# Altium schematic symbol library NXP_60_26022015.SCHLIB: 1306 symbols (part 23 of 28) (continued)
## PCA24S08AD
designator U?, comment 1024 × 8-bit CMOS EEPROM with access protection The PCA24S08A provides 8192 bits of serial Electrically Erasable and Programmable Read-Only Memory (EEPROM) organized as 1024 words of 8 bits each. Data bytes are received and transmitted via the serial I2 C-bus. Access permissions limiting reads or writes are set via the I2 C-bus to isolate blocks of memory from improper access. The PCA24S08A is intended to be pin compatible with standard 24C08 serial EEPROM devices except for pins 1, 2, and 3, which are address pins in the standard part. Other exceptions to the PCA24S08A serial EEPROM data sheet are noted in Section 6.6. All bits are sent to or read from the device, most significant bit first, in a manner consistent with the 24C08 serial EEPROM. The bit fields in this document are correspondingly listed with the MSB on the left and the LSB on the right. The EEPROM memory is broken up into 8 blocks of 1 kbit (128 bytes) each. Within each block, the memory is physically organized in to 8 pages of 128 bits (16 bytes) each. In addition to these 8 kbits, there are two more 128-bit pages that are used to store the access protection and ID information. There are a total of 8448 bits of EEPROM memory available in the PCA24S08A. Access protection (both read and write) is organized on a block basis for block 1 through block 7 and on a page and a block basis for block 0. Protection information for these blocks and pages is stored in one of the additional pages of EEPROM memory that is addressed separately from the main data storage array. SeeSection 6.4 for more details. The ID value is located in the ID page of the EEPROM, the second of the additional 16 byte pages. Writes from the serial interface may include from one byte to 16 bytes at a time, depending on the protocol followed by the bus master. All page accesses must be properly aligned to the internal EEPROM page. The EEPROM memory offers an endurance of 100,000 write cycles per byte, with 10 year data retention. Writes to the EEPROM take less than 5 ms to complete. After manufacturing, all EEPROM bits will be set to a value of ‘1’.    AAL Eindhoven MK
footprint SOT96-1
pins: 3 !PR!, 4 GND (power), 5 SDA, 6 SCL, 7 WP, 8 VCC (power)

## PCA24S08ADP
designator U?, comment 1024 × 8-bit CMOS EEPROM with access protection The PCA24S08A provides 8192 bits of serial Electrically Erasable and Programmable Read-Only Memory (EEPROM) organized as 1024 words of 8 bits each. Data bytes are received and transmitted via the serial I2 C-bus. Access permissions limiting reads or writes are set via the I2 C-bus to isolate blocks of memory from improper access. The PCA24S08A is intended to be pin compatible with standard 24C08 serial EEPROM devices except for pins 1, 2, and 3, which are address pins in the standard part. Other exceptions to the PCA24S08A serial EEPROM data sheet are noted in Section 6.6. All bits are sent to or read from the device, most significant bit first, in a manner consistent with the 24C08 serial EEPROM. The bit fields in this document are correspondingly listed with the MSB on the left and the LSB on the right. The EEPROM memory is broken up into 8 blocks of 1 kbit (128 bytes) each. Within each block, the memory is physically organized in to 8 pages of 128 bits (16 bytes) each. In addition to these 8 kbits, there are two more 128-bit pages that are used to store the access protection and ID information. There are a total of 8448 bits of EEPROM memory available in the PCA24S08A. Access protection (both read and write) is organized on a block basis for block 1 through block 7 and on a page and a block basis for block 0. Protection information for these blocks and pages is stored in one of the additional pages of EEPROM memory that is addressed separately from the main data storage array. SeeSection 6.4 for more details. The ID value is located in the ID page of the EEPROM, the second of the additional 16 byte pages. Writes from the serial interface may include from one byte to 16 bytes at a time, depending on the protocol followed by the bus master. All page accesses must be properly aligned to the internal EEPROM page. The EEPROM memory offers an endurance of 100,000 write cycles per byte, with 10 year data retention. Writes to the EEPROM take less than 5 ms to complete. After manufacturing, all EEPROM bits will be set to a value of ‘1’.    AAL Eindhoven MK
footprint SOT505-1
pins: 3 !PR!, 4 GND (power), 5 SDA, 6 SCL, 7 WP, 8 VCC (power)

## PCA82C250T
designator U?, comment CAN controller interface The PCA82C250 is the interface between a CAN protocol controller and the physical bus. The device provides differential transmit capability to the bus and differential receive capability to the CAN controller.    AAL Eindhoven MK
footprint SOT96-1
pins: 1 TXD (out), 2 GND, 3 VCC, 4 RXD, 5 VREF (power), 6 CANL, 7 CANH, 8 RS

## PCA82C251T
designator U?, comment CAN transceiver for 24 V systems The PCA82C251 is the interface between a CAN protocol controller and the physical bus. The device provides differential transmit capability to the bus and differential receive capability to the CAN controller    AAL Eindhoven MK
footprint SOT96-1
pins: 1 TXD (out), 2 GND, 3 VCC, 4 RXD, 5 VREF (power), 6 CANL, 7 CANH, 8 RS

## PCA2129T
designator U?, comment Accurate RTC with integrated quartz crystal for industrial The PCF2129T is a CMOS1  Real Time Clock (RTC) and calendar with an integrated Temperature Compensated Crystal (Xtal) Oscillator (TCXO) and a 32.768 kHz quartz crystal optimized for very high accuracy and very low power consumption. The PCF2129T has a selectable I2C-bus or SPI-bus, a backup battery switch-over circuit, a programmable watchdog function, a timestamp function, and many other features.    AAL Eindhoven MK
TEMPERATURE_RANGE: -30 °C to +80 °C
footprint SOT162-1
pins: 1 SCL, 2 SDI, 3 SDO (out), 4 SDA/!CE, 5 IFS, 6 !TS!, 7 CLKOUT (out), 8 VSS (power), 13 !INT1! (out), 14 BSS (out), 15 VBAT (power), 16 VDD (power)

## PCA8565BS
designator U?, comment Real time clock/calendar The PCA8565 is a CMOS real time clock and calendar optimized for low power consumption. A programmable clock output, interrupt output and voltage-low detector are also provided. All address and data are transferred serially via a two-line bidirectional I2C-bus. Maximum bus speed is 400 kbit/s. The built-in word address register is incremented automatically after each written or read data byte. AEC-Q100 compliant (PCA8565TS) for automotive applications.    AAL Eindhoven MK
footprint SOT650
pins: 1 OSCI, 2 OSCO, 4 !INT1! (out), 5 VSS (power), 6 SDA, 7 SCL, 8 CLKOUT (power), 9 VDD (power)

## PCA8565TS
designator U?, comment Real time clock/calendar The PCA8565 is a CMOS real time clock and calendar optimized for low power consumption. A programmable clock output, interrupt output and voltage-low detector are also provided. All address and data are transferred serially via a two-line bidirectional I2C-bus. Maximum bus speed is 400 kbit/s. The built-in word address register is incremented automatically after each written or read data byte. AEC-Q100 compliant (PCA8565TS) for automotive applications.    AAL Eindhoven MK
footprint SOT505-1
pins: 1 OSCI, 2 OSCO, 3 !INT1! (out), 4 VSS (power), 5 SDA, 6 SCL, 7 CLKOUT (power), 8 VDD (power)

## PCA9509ADP
designator U?, comment The PCA9509A is a level translating I2C-bus/SMBus repeater with two voltage supplies that enables processor low voltage 2-wire serial bus to interface with standard I2C-bus or SMBus I/O.   AAL Eindhoven MK
footprint SOT505-1
pins: 1 VCC(A) (power), 2 A1, 3 A2, 4 GND (power), 5 EN, 6 B2, 7 B1, 8 VCC(B) (power)

## PCA9509AGM
designator U?, comment The PCA9509A is a level translating I2C-bus/SMBus repeater with two voltage supplies that enables processor low voltage 2-wire serial bus to interface with standard I2C-bus or SMBus I/O.   AAL Eindhoven MK
footprint SOT902-1/2/3
pins: 1 VCC(A) (power), 2 A1, 3 A2, 4 GND (power), 5 EN, 6 B2, 7 B1, 8 VCC(B) (power)

## PCA9509D
designator U?, comment The PCA9509 is a level translating I2C-bus/SMBus repeater with two voltage supplies that enables processor low voltage 2-wire serial bus to interface with standard I2C-bus or SMBus I/O.   AAL Eindhoven MK
footprint SOT96-1
pins: 1 VCC(A) (power), 2 A1, 3 A2, 4 GND (power), 5 EN, 6 B2, 7 B1, 8 VCC(B) (power)

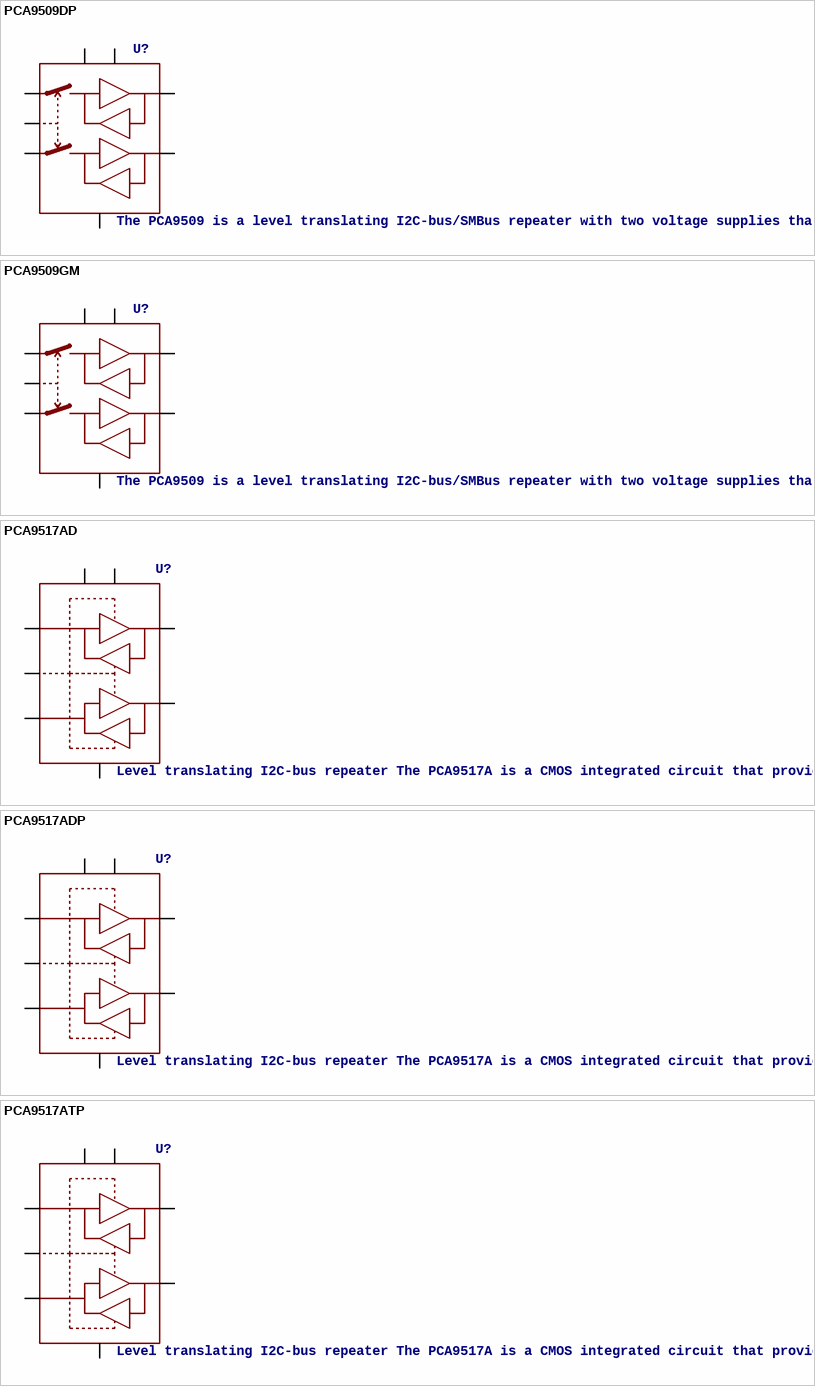
[diagram p158: symbols PCA9509DP to PCA9517ATP]

## PCA9509DP
designator U?, comment The PCA9509 is a level translating I2C-bus/SMBus repeater with two voltage supplies that enables processor low voltage 2-wire serial bus to interface with standard I2C-bus or SMBus I/O.   AAL Eindhoven MK
footprint SOT505-1
pins: 1 VCC(A) (power), 2 A1, 3 A2, 4 GND (power), 5 EN, 6 B2, 7 B1, 8 VCC(B) (power)

## PCA9509GM
designator U?, comment The PCA9509 is a level translating I2C-bus/SMBus repeater with two voltage supplies that enables processor low voltage 2-wire serial bus to interface with standard I2C-bus or SMBus I/O.   AAL Eindhoven MK
footprint SOT902-1/2/3
pins: 1 VCC(A) (power), 2 A1, 3 A2, 4 GND (power), 5 EN, 6 B2, 7 B1, 8 VCC(B) (power)

## PCA9517AD
designator U?, comment Level translating I2C-bus repeater The PCA9517A is a CMOS integrated circuit that provides level shifting between low voltage (down to 0.9 V) and higher voltage (2.7 V to 5.5 V) I2C-bus or SMBus applications. While retaining all the operating modes and features of the I2C-bus system during the level shifts, it also permits extension of the I2C-bus by providing bidirectional buffering for both the data (SDA) and the clock (SCL) lines, thus enabling two buses of 400 pF. Using the PCA9517A enables the system designer to isolate two halves of a bus for both voltage and capacitance. The SDA and SCL pins are overvoltage tolerant and are high-impedance when the PCA9517A is unpowered. The 2.7 V to 5.5 V bus port B drivers behave much like the drivers on the PCA9515A device, while the adjustable voltage bus port A drivers drive more current and eliminate the static offset voltage. This results in a LOW on the port B translating into a nearly 0 V LOW on the port A which accommodates smaller voltage swings of lower voltage logic. The static offset design of the port B PCA9517A I/O drivers prevent them from being connected to another device that has rise time accelerator including the PCA9510, PCA9511, PCA9512, PCA9513, PCA9514, PCA9515A, PCA9516A, PCA9517A (port B), or PCA9518. Port A of two or more PCA9517As can be connected together, however, to allow a star topography with port A on the common bus, and port A can be connected directly to any other buffer with static or dynamic offset voltage. Multiple PCA9517As can be connected in series, port A to port B, with no build-up in offset voltage with only time of flight delays to consider. The PCA9517A drivers are not enabled unless VCC(A) is above 0.8 V and VCC(B) is above 2.5 V. The EN pin can also be used to turn the drivers on and off under system control. Caution should be observed to only change the state of the enable pin when the bus is idle. The output pull-down on the port B internal buffer LOW is set for approximately 0.5 V, while the input threshold of the internal buffer is set about 70 mV lower (0.43 V). When the port B I/O is driven LOW internally, the LOW is not recognized as a LOW by the input. This prevents a lock-up condition from occurring. The output pull-down on port A drives a hard LOW and the input level is set at 0.3VCC(A) to accommodate the need for a lower LOW level in systems where the low voltage side supply voltage is as low as 0.9 V.    AAL Eindhoven MK
footprint SOT96-1
pins: 1 VCC(A) (power), 2 SCLA, 3 SDAA, 4 GND (power), 5 EN, 6 SDAB, 7 SCLB, 8 VCC(B) (power)

## PCA9517ADP
designator U?, comment Level translating I2C-bus repeater The PCA9517A is a CMOS integrated circuit that provides level shifting between low voltage (down to 0.9 V) and higher voltage (2.7 V to 5.5 V) I2C-bus or SMBus applications. While retaining all the operating modes and features of the I2C-bus system during the level shifts, it also permits extension of the I2C-bus by providing bidirectional buffering for both the data (SDA) and the clock (SCL) lines, thus enabling two buses of 400 pF. Using the PCA9517A enables the system designer to isolate two halves of a bus for both voltage and capacitance. The SDA and SCL pins are overvoltage tolerant and are high-impedance when the PCA9517A is unpowered. The 2.7 V to 5.5 V bus port B drivers behave much like the drivers on the PCA9515A device, while the adjustable voltage bus port A drivers drive more current and eliminate the static offset voltage. This results in a LOW on the port B translating into a nearly 0 V LOW on the port A which accommodates smaller voltage swings of lower voltage logic. The static offset design of the port B PCA9517A I/O drivers prevent them from being connected to another device that has rise time accelerator including the PCA9510, PCA9511, PCA9512, PCA9513, PCA9514, PCA9515A, PCA9516A, PCA9517A (port B), or PCA9518. Port A of two or more PCA9517As can be connected together, however, to allow a star topography with port A on the common bus, and port A can be connected directly to any other buffer with static or dynamic offset voltage. Multiple PCA9517As can be connected in series, port A to port B, with no build-up in offset voltage with only time of flight delays to consider. The PCA9517A drivers are not enabled unless VCC(A) is above 0.8 V and VCC(B) is above 2.5 V. The EN pin can also be used to turn the drivers on and off under system control. Caution should be observed to only change the state of the enable pin when the bus is idle. The output pull-down on the port B internal buffer LOW is set for approximately 0.5 V, while the input threshold of the internal buffer is set about 70 mV lower (0.43 V). When the port B I/O is driven LOW internally, the LOW is not recognized as a LOW by the input. This prevents a lock-up condition from occurring. The output pull-down on port A drives a hard LOW and the input level is set at 0.3VCC(A) to accommodate the need for a lower LOW level in systems where the low voltage side supply voltage is as low as 0.9 V.    AAL Eindhoven MK
footprint SOT505-1
pins: 1 VCC(A) (power), 2 SCLA, 3 SDAA, 4 GND (power), 5 EN, 6 SDAB, 7 SCLB, 8 VCC(B) (power)

## PCA9517ATP
designator U?, comment Level translating I2C-bus repeater The PCA9517A is a CMOS integrated circuit that provides level shifting between low voltage (down to 0.9 V) and higher voltage (2.7 V to 5.5 V) I2C-bus or SMBus applications. While retaining all the operating modes and features of the I2C-bus system during the level shifts, it also permits extension of the I2C-bus by providing bidirectional buffering for both the data (SDA) and the clock (SCL) lines, thus enabling two buses of 400 pF. Using the PCA9517A enables the system designer to isolate two halves of a bus for both voltage and capacitance. The SDA and SCL pins are overvoltage tolerant and are high-impedance when the PCA9517A is unpowered. The 2.7 V to 5.5 V bus port B drivers behave much like the drivers on the PCA9515A device, while the adjustable voltage bus port A drivers drive more current and eliminate the static offset voltage. This results in a LOW on the port B translating into a nearly 0 V LOW on the port A which accommodates smaller voltage swings of lower voltage logic. The static offset design of the port B PCA9517A I/O drivers prevent them from being connected to another device that has rise time accelerator including the PCA9510, PCA9511, PCA9512, PCA9513, PCA9514, PCA9515A, PCA9516A, PCA9517A (port B), or PCA9518. Port A of two or more PCA9517As can be connected together, however, to allow a star topography with port A on the common bus, and port A can be connected directly to any other buffer with static or dynamic offset voltage. Multiple PCA9517As can be connected in series, port A to port B, with no build-up in offset voltage with only time of flight delays to consider. The PCA9517A drivers are not enabled unless VCC(A) is above 0.8 V and VCC(B) is above 2.5 V. The EN pin can also be used to turn the drivers on and off under system control. Caution should be observed to only change the state of the enable pin when the bus is idle. The output pull-down on the port B internal buffer LOW is set for approximately 0.5 V, while the input threshold of the internal buffer is set about 70 mV lower (0.43 V). When the port B I/O is driven LOW internally, the LOW is not recognized as a LOW by the input. This prevents a lock-up condition from occurring. The output pull-down on port A drives a hard LOW and the input level is set at 0.3VCC(A) to accommodate the need for a lower LOW level in systems where the low voltage side supply voltage is as low as 0.9 V.    AAL Eindhoven MK
footprint SOT1069-2
pins: 1 SDAA, 2 GND (power), 3 EN, 4 SDAB, 5 SCLB, 6 VCC(B) (power), 7 VCC(A) (power), 8 SCLA

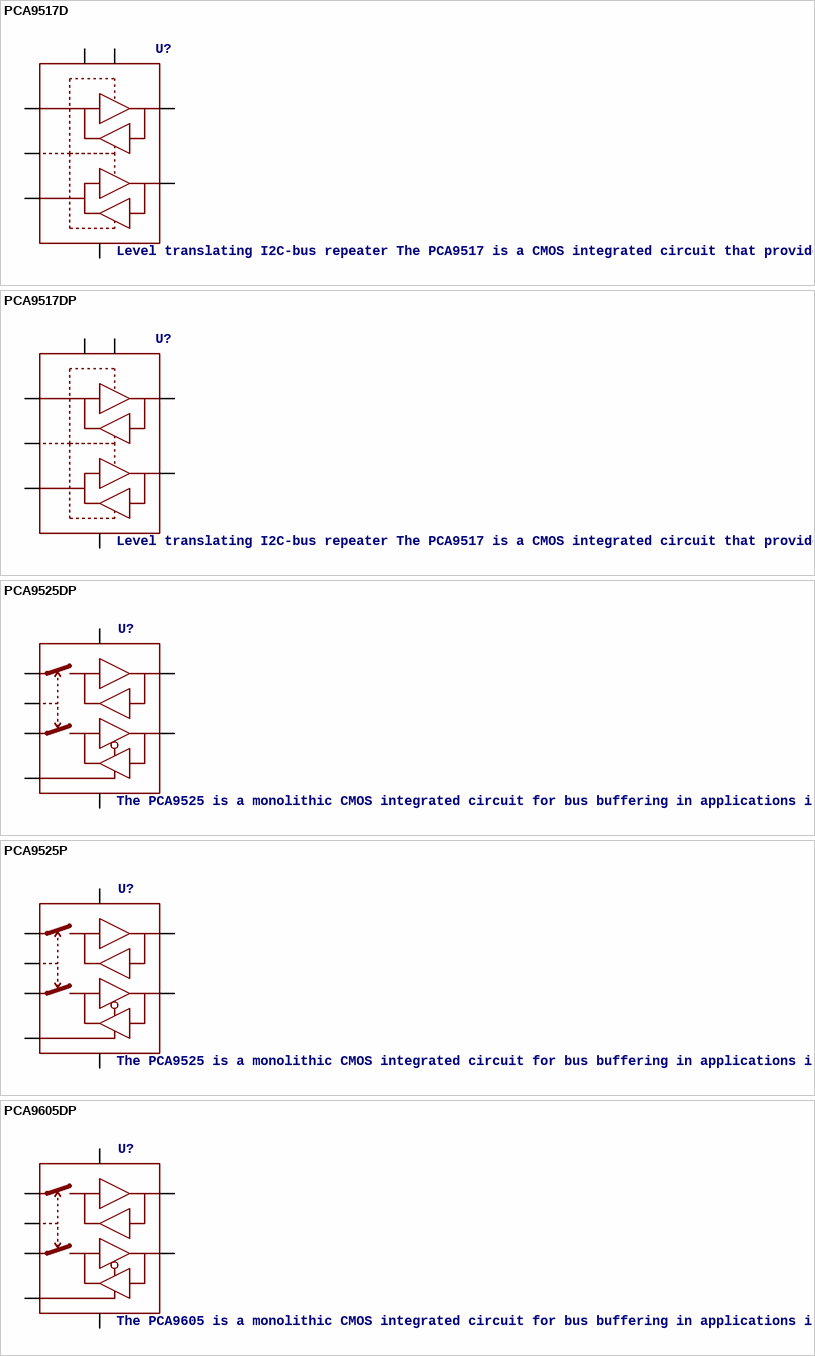
[diagram p159: symbols PCA9517D to PCA9605DP]

## PCA9517D
designator U?, comment Level translating I2C-bus repeater The PCA9517 is a CMOS integrated circuit that provides level shifting between low voltage (down to 0.9 V) and higher voltage (2.7 V to 5.5 V) I2C-bus or SMBus applications. While retaining all the operating modes and features of the I2C-bus system during the level shifts, it also permits extension of the I2C-bus by providing bidirectional buffering for both the data (SDA) and the clock (SCL) lines, thus enabling two buses of 400 pF. Using the PCA9517 enables the system designer to isolate two halves of a bus for both voltage and capacitance. The SDA and SCL pins are over voltage tolerant and are high-impedance when the PCA9517 is unpowered. The 2.7 V to 5.5 V bus B-side drivers behave much like the drivers on the PCA9515A device, while the adjustable voltage bus A-side drivers drive more current and eliminate the static offset voltage. This results in a LOW on the B-side translating into a nearly 0 V LOW on the A-side which accommodates smaller voltage swings of lower voltage logic. The static offset design of the B-side PCA9517 I/O drivers prevent them from being connected to another device that has rise time accelerator including the PCA9510, PCA9511, PCA9512, PCA9513, PCA9514, PCA9515A, PCA9516A, PCA9517 (B-side), or PCA9518. The A-side of two or more PCA9517s can be connected together, however, to allow a star topography with the A-side on the common bus, and the A-side can be connected directly to any other buffer with static or dynamic offset voltage. Multiple PCA9517s can be connected in series, A-side to B-side, with no build-up in offset voltage with only time of ﬂight delays to consider. The PCA9517 drivers are not enabled unless VCCA is above 0.8 V and VCC is above 2.5 V. The EN pin can also be used to turn the drivers on and off under system control. Caution should be observed to only change the state of the enable pin when the bus is idle. The output pull-down on the B-side internal buffer LOW is set for approximately 0.5 V, while the input threshold of the internal buffer is set about 70 mV lower (0.43 V). When the B-side I/O is driven LOW internally, the LOW is not recognized as a LOW by the input. This prevents a lock-up condition from occurring. The output pull-down on the A-side drives a hard LOW and the input level is set at 0.3VCCA to accommodate the need for a lower LOW level in systems where the low voltage side supply voltage is as low as 0.9 V.    AAL Eindhoven MK
footprint SOT96-1
pins: 1 VCC(A) (power), 2 SCLA, 3 SDAA, 4 GND (power), 5 EN, 6 SDAB, 7 SCLB, 8 VCC(B) (power)

## PCA9517DP
designator U?, comment Level translating I2C-bus repeater The PCA9517 is a CMOS integrated circuit that provides level shifting between low voltage (down to 0.9 V) and higher voltage (2.7 V to 5.5 V) I2C-bus or SMBus applications. While retaining all the operating modes and features of the I2C-bus system during the level shifts, it also permits extension of the I2C-bus by providing bidirectional buffering for both the data (SDA) and the clock (SCL) lines, thus enabling two buses of 400 pF. Using the PCA9517 enables the system designer to isolate two halves of a bus for both voltage and capacitance. The SDA and SCL pins are over voltage tolerant and are high-impedance when the PCA9517 is unpowered. The 2.7 V to 5.5 V bus B-side drivers behave much like the drivers on the PCA9515A device, while the adjustable voltage bus A-side drivers drive more current and eliminate the static offset voltage. This results in a LOW on the B-side translating into a nearly 0 V LOW on the A-side which accommodates smaller voltage swings of lower voltage logic. The static offset design of the B-side PCA9517 I/O drivers prevent them from being connected to another device that has rise time accelerator including the PCA9510, PCA9511, PCA9512, PCA9513, PCA9514, PCA9515A, PCA9516A, PCA9517 (B-side), or PCA9518. The A-side of two or more PCA9517s can be connected together, however, to allow a star topography with the A-side on the common bus, and the A-side can be connected directly to any other buffer with static or dynamic offset voltage. Multiple PCA9517s can be connected in series, A-side to B-side, with no build-up in offset voltage with only time of ﬂight delays to consider. The PCA9517 drivers are not enabled unless VCCA is above 0.8 V and VCC is above 2.5 V. The EN pin can also be used to turn the drivers on and off under system control. Caution should be observed to only change the state of the enable pin when the bus is idle. The output pull-down on the B-side internal buffer LOW is set for approximately 0.5 V, while the input threshold of the internal buffer is set about 70 mV lower (0.43 V). When the B-side I/O is driven LOW internally, the LOW is not recognized as a LOW by the input. This prevents a lock-up condition from occurring. The output pull-down on the A-side drives a hard LOW and the input level is set at 0.3VCCA to accommodate the need for a lower LOW level in systems where the low voltage side supply voltage is as low as 0.9 V.    AAL Eindhoven MK
footprint SOT505-1
pins: 1 VCC(A) (power), 2 SCLA, 3 SDAA, 4 GND (power), 5 EN, 6 SDAB, 7 SCLB, 8 VCC(B) (power)

## PCA9525DP
designator U?, comment The PCA9525 is a monolithic CMOS integrated circuit for bus buffering in applications including I2C-bus, SMBus, DDC, PMBus, and other systems based on similar principles.   AAL Eindhoven MK
footprint SOT505-1
pins: 1 EN, 2 SCL, 3 SCLI, 4 VDD (power), 5 DIR, 6 SDAI, 7 SDA, 8 VSS (power)

## PCA9525P
designator U?, comment The PCA9525 is a monolithic CMOS integrated circuit for bus buffering in applications including I2C-bus, SMBus, DDC, PMBus, and other systems based on similar principles.   AAL Eindhoven MK
footprint SOT96-1
pins: 1 EN, 2 SCL, 3 SCLI, 4 VDD (power), 5 DIR, 6 SDAI, 7 SDA, 8 VSS (power)

## PCA9605DP
designator U?, comment The PCA9605 is a monolithic CMOS integrated circuit for bus buffering in applications including I2C-bus, SMBus, DDC, PMBus, and other systems based on similar principles.   AAL Eindhoven MK
footprint SOT505-1
pins: 1 EN, 2 SCL, 3 SCLI, 4 VSS (power), 5 DIR, 6 SDAI, 7 SDA, 8 VDD (power)

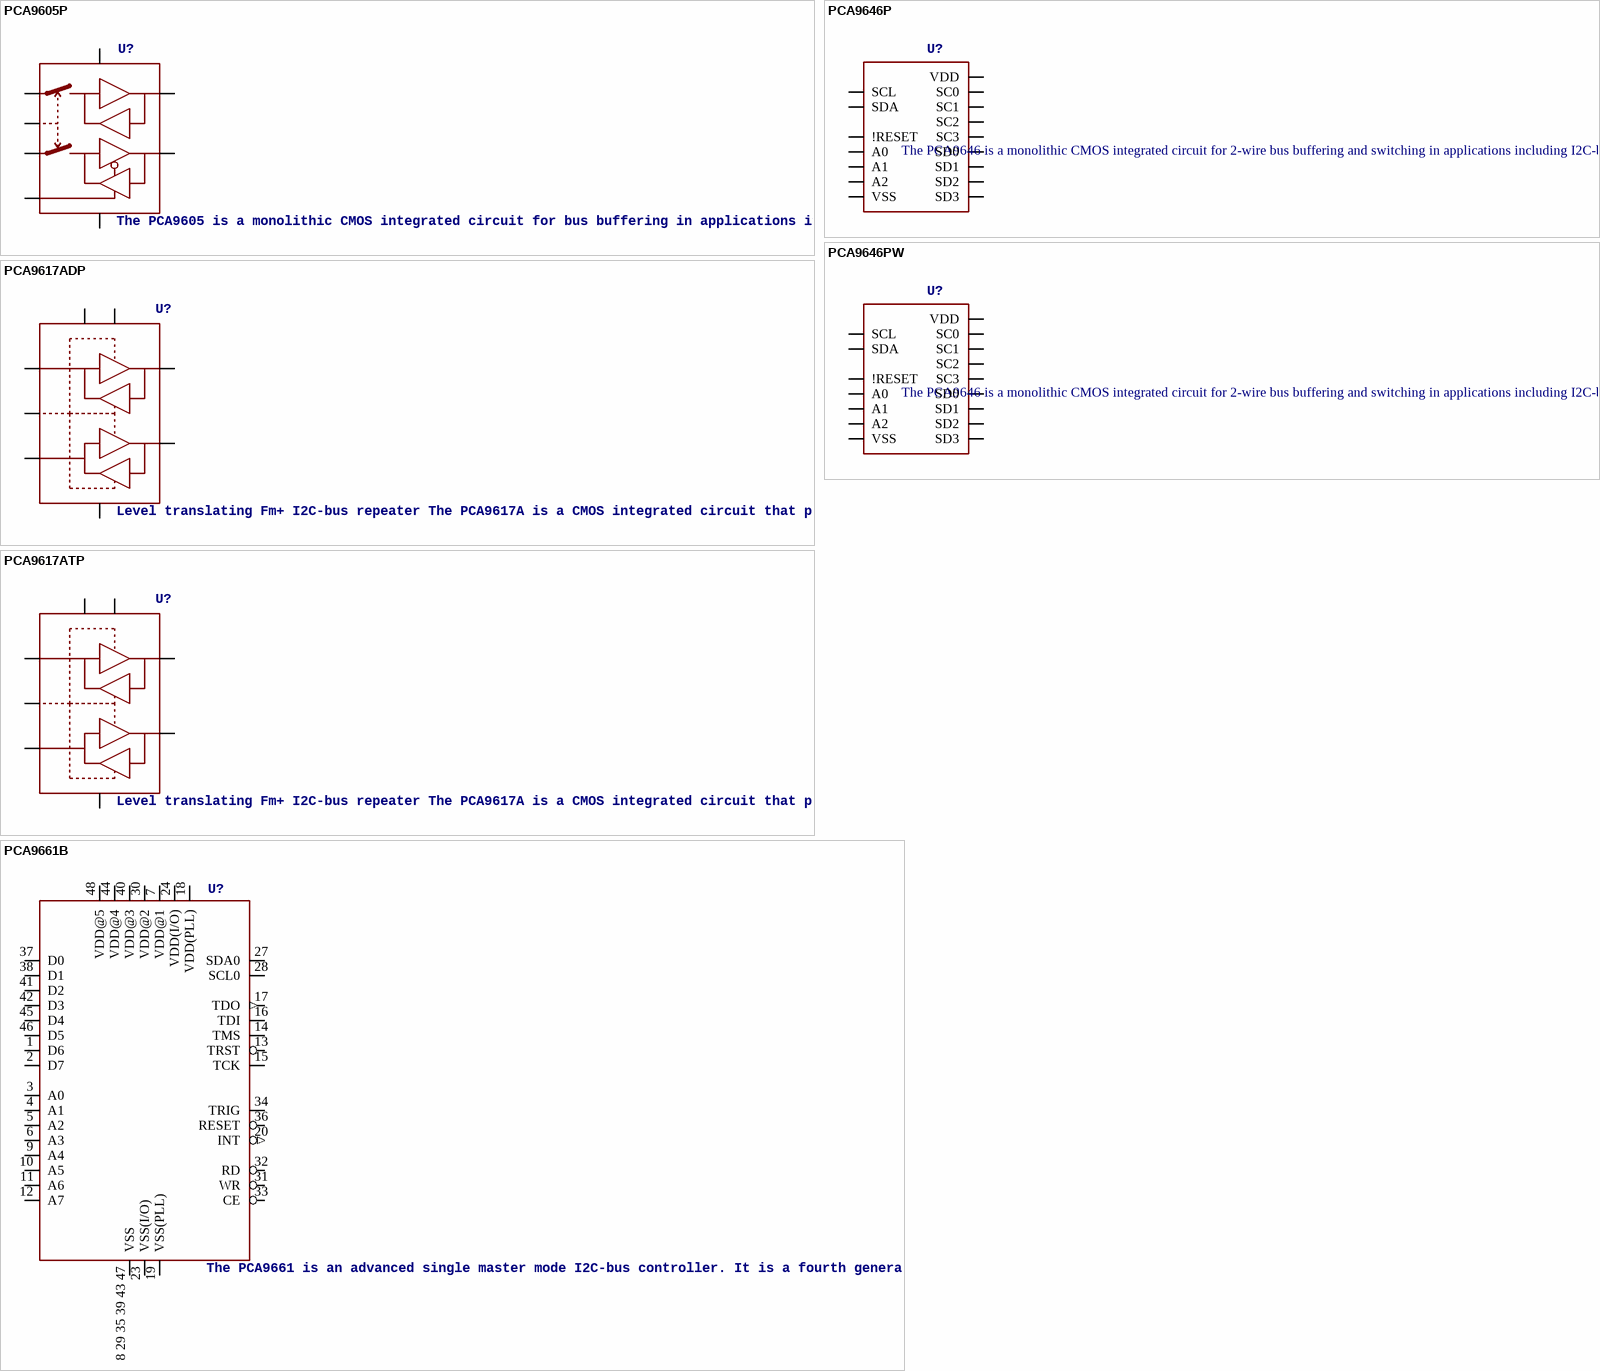
[diagram p160: symbols PCA9605P to PCA9661B]

## PCA9605P
designator U?, comment The PCA9605 is a monolithic CMOS integrated circuit for bus buffering in applications including I2C-bus, SMBus, DDC, PMBus, and other systems based on similar principles.   AAL Eindhoven MK
footprint SOT96-1
pins: 1 EN, 2 SCL, 3 SCLI, 4 VSS (power), 5 DIR, 6 SDAI, 7 SDA, 8 VDD (power)

## PCA9617ADP
designator U?, comment Level translating Fm+ I2C-bus repeater The PCA9617A is a CMOS integrated circuit that provides level shifting between low voltage (0.8 V to 5.5 V) and higher voltage (2.2 V to 5.5 V) Fast-mode Plus (Fm+) I2 C-bus or SMBus applications. While retaining all the operating modes and features of the I 2 C-bus system during the level shifts, it also permits extension of the I2 C-bus by providing bidirectional buffering for both the data (SDA) and the clock (SCL) lines, thus enabling two buses of 540 pF at 1 MHz or up to 4000 pF at lower speeds. Using the PCA9617A enables the system designer to isolate two halves of a bus for both voltage and capacitance. The SDA and SCL pins are overvoltage tolerant and are high-impedance when the PCA9617A is unpowered. The 2.2 V to 5.5 V bus port B drivers have the static level offset, while the adjustable voltage bus port A drivers eliminate the static offset voltage. This results in a LOW on the port B translating into a nearly 0 V LOW on the port A which accommodates the smaller voltage swings of lower voltage logic. The static offset design of the port B PCA9617A I/O drivers prevents them from being connected to the static or incremented offset of other bus buffers. Port A of two or more PCA9617As can be connected together, however, to allow a star topography with port A on the common bus, and port A can be connected directly to any other buffer with static or incremented offset outputs. Multiple PCA9617As can be connected in series, port A to port B, with no build-up in offset voltage with only time of flight delays to consider. The PCA9617A drivers are not enabled unless VCC(A) is above 0.8 V and VCC(B) is above 2.2 V. The EN pin is referenced to VCC(B) and can also be used to turn the drivers on and off under system control. Caution should be observed to only change the state of the enable pin when the bus is idle. The output pull-down on the port B internal buffer LOW is set for approximately 0.55 V, while the input threshold of the internal buffer is set about 90 mV lower (0.45 V). When the port B I/O is driven LOW internally, the LOW is not recognized as a LOW by the input. This prevents a latching condition from occurring. The output pull-down on port A drives a hard LOW and the input level is set at 0.35VCC(A) to accommodate the need for a lower LOW level in systems where the low voltage side supply voltage is as low as 0.8 V.    AAL Eindhoven MK
footprint SOT505-1
pins: 1 VCC(A) (power), 2 SCLA, 3 SDAA, 4 GND (power), 5 EN, 6 SDAB, 7 SCLB, 8 VCC(B) (power)

## PCA9617ATP
designator U?, comment Level translating Fm+ I2C-bus repeater The PCA9617A is a CMOS integrated circuit that provides level shifting between low voltage (0.8 V to 5.5 V) and higher voltage (2.2 V to 5.5 V) Fast-mode Plus (Fm+) I2 C-bus or SMBus applications. While retaining all the operating modes and features of the I 2 C-bus system during the level shifts, it also permits extension of the I2 C-bus by providing bidirectional buffering for both the data (SDA) and the clock (SCL) lines, thus enabling two buses of 540 pF at 1 MHz or up to 4000 pF at lower speeds. Using the PCA9617A enables the system designer to isolate two halves of a bus for both voltage and capacitance. The SDA and SCL pins are overvoltage tolerant and are high-impedance when the PCA9617A is unpowered. The 2.2 V to 5.5 V bus port B drivers have the static level offset, while the adjustable voltage bus port A drivers eliminate the static offset voltage. This results in a LOW on the port B translating into a nearly 0 V LOW on the port A which accommodates the smaller voltage swings of lower voltage logic. The static offset design of the port B PCA9617A I/O drivers prevents them from being connected to the static or incremented offset of other bus buffers. Port A of two or more PCA9617As can be connected together, however, to allow a star topography with port A on the common bus, and port A can be connected directly to any other buffer with static or incremented offset outputs. Multiple PCA9617As can be connected in series, port A to port B, with no build-up in offset voltage with only time of flight delays to consider. The PCA9617A drivers are not enabled unless VCC(A) is above 0.8 V and VCC(B) is above 2.2 V. The EN pin is referenced to VCC(B) and can also be used to turn the drivers on and off under system control. Caution should be observed to only change the state of the enable pin when the bus is idle. The output pull-down on the port B internal buffer LOW is set for approximately 0.55 V, while the input threshold of the internal buffer is set about 90 mV lower (0.45 V). When the port B I/O is driven LOW internally, the LOW is not recognized as a LOW by the input. This prevents a latching condition from occurring. The output pull-down on port A drives a hard LOW and the input level is set at 0.35VCC(A) to accommodate the need for a lower LOW level in systems where the low voltage side supply voltage is as low as 0.8 V.    AAL Eindhoven MK
footprint SOT1069-2
pins: 1 SDAA, 2 GND (power), 3 EN, 4 SDAB, 5 SCLB, 6 VCC(B) (power), 7 VCC(A) (power), 8 SCLA